# Altium footprint library LukaLIBRARY.PcbLib: 784 footprints (part 2 of 49)
Each footprint in its own frame and in the unit in brackets; x right, y up, seen from the top. Pads: shape width x height; smd on the part's side, far side on the other; paste and mask are expansions set on the pad; w line width, h text height; cw(c..) or ccw(c..) is an arc to the next point about the centre after c.
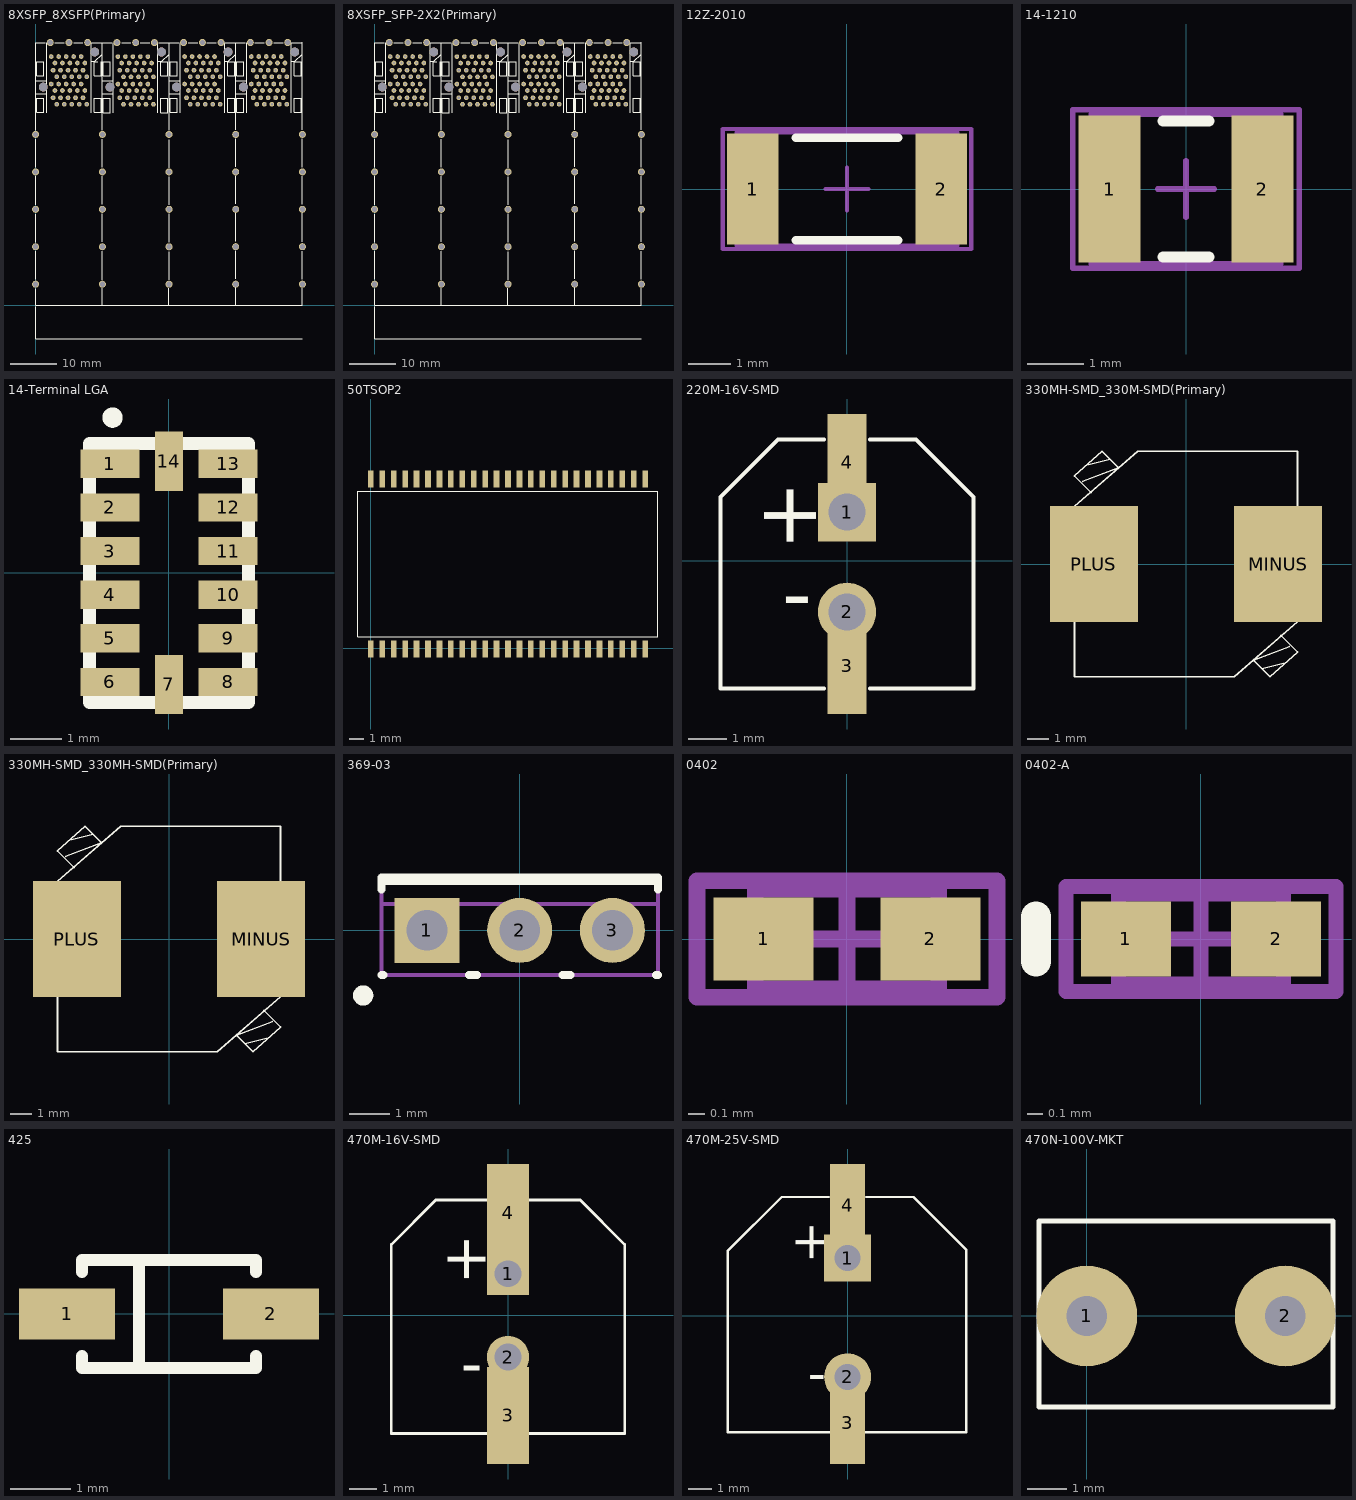
[diagram p1: the footprints below, top view; thin cyan lines are the x and y axes]

## 8XSFP_8XSFP(Primary) [mm]
pads (205):
  round 1.5 hole 1.1: 161(3.13,56.14) 162(7.13,56.14) 163(11.12,56.14) 164(17.38,56.13) 165(21.38,56.13) 166(25.37,56.13) 167(31.63,56.14) 168(35.63,56.14) 169(39.62,56.14) 170(45.88,56.14) 171(49.88,56.14) 172(53.87,56.14) 181(0,36.5) 182(14.26,36.5) 183(28.5,36.5) 184(42.75,36.5) 185(57,36.5) 186(0,28.5) 187(14.26,28.5) 188(28.5,28.5) 189(42.75,28.5) 190(57,28.5) 191(0,20.5) 192(14.26,20.5) 193(28.52,20.5) 194(42.76,20.5) 195(57,20.5) 196(0,12.5) 197(14.26,12.5) 198(28.51,12.49) 199(42.75,12.51) 200(57,12.51) 201(0,4.5) 202(14.26,4.5) 203(28.51,4.5) 204(42.75,4.5) 205(57,4.5)
  round 1.9 hole 1.9: 173(12.63,54.12) 174(26.88,54.11) 175(41.13,54.12) 176(55.38,54.12) 177(1.63,46.62) 178(15.88,46.61) 179(30.13,46.62) 180(44.38,46.62)
  round 1 hole 0.47: L1A(10.53,45.89) L1B(24.78,45.88) L1C(39.03,45.89) L1D(53.28,45.89) L2A(9.73,47.27) L2B(23.98,47.26) L2C(38.23,47.27) L2D(52.48,47.27) L3A(8.93,45.89) L3B(23.18,45.88) L3C(37.43,45.89) L3D(51.68,45.89) L4A(8.13,47.27) L4B(22.38,47.26) L4C(36.63,47.27) L4D(50.88,47.27) L5A(7.33,45.89) L5B(21.58,45.88) L5C(35.83,45.89) L5D(50.08,45.89) L6A(6.53,47.27) L6B(20.78,47.26) L6C(35.03,47.27) L6D(49.28,47.27) L7A(5.73,45.89) L7B(19.98,45.88) L7C(34.23,45.89) L7D(48.48,45.89) L8A(4.93,47.27) L8B(19.18,47.26) L8C(33.43,47.27) L8D(47.68,47.27) L9A(4.13,45.89) L9B(18.38,45.88) L9C(32.63,45.89) L9D(46.88,45.89) L10A(3.33,47.27) L10B(17.58,47.26) L10C(31.83,47.27) L10D(46.08,47.27) L11A(3.73,44.34) L11B(17.98,44.33) L11C(32.23,44.34) L11D(46.48,44.34) L12A(4.53,42.95) L12B(18.78,42.94) L12C(33.03,42.95) L12D(47.28,42.95) L13A(5.33,44.34) L13B(19.58,44.33) L13C(33.83,44.34) L13D(48.08,44.34) L14A(6.13,42.95) L14B(20.38,42.94) L14C(34.63,42.95) L14D(48.88,42.95) L15A(6.93,44.34) L15B(21.18,44.33) L15C(35.43,44.34) L15D(49.68,44.34) L16A(7.73,42.95) L16B(21.98,42.94) L16C(36.23,42.95) L16D(50.48,42.95) L17A(8.53,44.34) L17B(22.78,44.33) L17C(37.03,44.34) L17D(51.28,44.34) L18A(9.33,42.95) L18B(23.58,42.94) L18C(37.83,42.95) L18D(52.08,42.95) L19A(10.13,44.34) L19B(24.38,44.33) L19C(38.63,44.34) L19D(52.88,44.34) L20A(10.93,42.95) L20B(25.18,42.94) L20C(39.43,42.95) L20D(53.68,42.95) T1A(3.73,50.21) T1B(17.98,50.2) T1C(32.23,50.21) T1D(46.48,50.21) T2A(4.53,48.82) T2B(18.78,48.81) T2C(33.03,48.82) T2D(47.28,48.82) T3A(5.33,50.21) T3B(19.58,50.2) T3C(33.83,50.21) T3D(48.08,50.21) T4A(6.13,48.82) T4B(20.38,48.81) T4C(34.63,48.82) T4D(48.88,48.82) T5A(6.93,50.21) T5B(21.18,50.2) T5C(35.43,50.21) T5D(49.68,50.21) T6A(7.73,48.82) T6B(21.98,48.81) T6C(36.23,48.82) T6D(50.48,48.82) T7A(8.53,50.21) T7B(22.78,50.2) T7C(37.03,50.21) T7D(51.28,50.21) T8A(9.33,48.82) T8B(23.58,48.81) T8C(37.83,48.82) T8D(52.08,48.82) T9A(10.13,50.21) T9B(24.38,50.2) T9C(38.63,50.21) T9D(52.88,50.21) T10A(10.93,48.82) T10B(25.18,48.81) T10C(39.43,48.82) T10D(53.68,48.82) T11A(10.53,51.76) T11B(24.78,51.75) T11C(39.03,51.76) T11D(53.28,51.76) T12A(9.73,53.14) T12B(23.98,53.13) T12C(38.23,53.14) T12D(52.48,53.14) T13A(8.93,51.76) T13B(23.18,51.75) T13C(37.43,51.76) T13D(51.68,51.76) T14A(8.13,53.14) T14B(22.38,53.13) T14C(36.63,53.14) T14D(50.88,53.14) T15A(7.33,51.76) T15B(21.58,51.75) T15C(35.83,51.76) T15D(50.08,51.76) T16A(6.53,53.14) T16B(20.78,53.13) T16C(35.03,53.14) T16D(49.28,53.14) T17A(5.73,51.76) T17B(19.98,51.75) T17C(34.23,51.76) T17D(48.48,51.76) T18A(4.93,53.14) T18B(19.18,53.13) T18C(33.43,53.14) T18D(47.68,53.14) T19A(4.13,51.76) T19B(18.38,51.75) T19C(32.63,51.76) T19D(46.88,51.76) T20A(3.33,53.14) T20B(17.58,53.13) T20C(31.83,53.14) T20D(46.08,53.14)
Top Overlay:
  drawing of 168 lines, arcs and shapes, not listed
Bottom Overlay:
  text "T19" at 3.59,51.03 h0.79
  text "T20" at 2.83,52.42 h0.79
  text "T1" at 2.84,49.48 h0.79
  text "T19" at 17.84,51.02 h0.79
  text "T20" at 17.08,52.41 h0.79
  text "T1" at 17.09,49.47 h0.79
  text "L1" at 26.89,45.14 h0.79
  text "L20" at 27.72,42.23 h0.79
  text "L19" at 27.74,43.64 h0.79
  text "L2" at 26.89,46.48 h0.79
  text "T19" at 32.09,51.03 h0.79
  text "T20" at 31.33,52.42 h0.79
  text "T1" at 31.34,49.48 h0.79
  text "L1" at 41.14,45.15 h0.79
  text "L2" at 41.14,46.49 h0.79
  text "L20" at 41.97,42.24 h0.79
  text "L19" at 41.99,43.65 h0.79
  text "T19" at 46.34,51.03 h0.79
  text "T20" at 45.58,52.42 h0.79
  text "T1" at 45.59,49.48 h0.79
  text "L1" at 55.39,45.15 h0.79
  text "L20" at 56.22,42.24 h0.79
  text "L19" at 56.24,43.65 h0.79
  text "L2" at 55.39,46.49 h0.79
  text "T2" at 3.59,48.13 h0.79
  text "T2" at 17.84,48.12 h0.79
  text "T2" at 32.09,48.13 h0.79
  text "T2" at 46.34,48.13 h0.79
  text "L1" at 12.64,45.15 h0.79
  text "L20" at 13.47,42.24 h0.79
  text "L19" at 13.49,43.65 h0.79
  text "L2" at 12.64,46.49 h0.79
Top Solder:
  drawing of 160 lines, arcs and shapes, not listed

## 8XSFP_SFP-2X2(Primary) [mm]
pads (205):
  round 1 hole 0.47: 1A(3.73,50.21) 1B(10.53,45.89) 1C(17.98,50.2) 1D(24.78,45.88) 1E(32.23,50.21) 1F(39.03,45.89) 1G(46.48,50.21) 1H(53.28,45.89) 2A(4.53,48.82) 2B(9.73,47.27) 2C(18.78,48.81) 2D(23.98,47.26) 2E(33.03,48.82) 2F(38.23,47.27) 2G(47.28,48.82) 2H(52.48,47.27) 3A(5.33,50.21) 3B(8.93,45.89) 3C(19.58,50.2) 3D(23.18,45.88) 3E(33.83,50.21) 3F(37.43,45.89) 3G(48.08,50.21) 3H(51.68,45.89) 4A(6.13,48.82) 4B(8.13,47.27) 4C(20.38,48.81) 4D(22.38,47.26) 4E(34.63,48.82) 4F(36.63,47.27) 4G(48.88,48.82) 4H(50.88,47.27) 5A(6.93,50.21) 5B(7.33,45.89) 5C(21.18,50.2) 5D(21.58,45.88) 5E(35.43,50.21) 5F(35.83,45.89) 5G(49.68,50.21) 5H(50.08,45.89) 6A(7.73,48.82) 6B(6.53,47.27) 6C(21.98,48.81) 6D(20.78,47.26) 6E(36.23,48.82) 6F(35.03,47.27) 6G(50.48,48.82) 6H(49.28,47.27) 7A(8.53,50.21) 7B(5.73,45.89) 7C(22.78,50.2) 7D(19.98,45.88) 7E(37.03,50.21) 7F(34.23,45.89) 7G(51.28,50.21) 7H(48.48,45.89) 8A(9.33,48.82) 8B(4.93,47.27) 8C(23.58,48.81) 8D(19.18,47.26) 8E(37.83,48.82) 8F(33.43,47.27) 8G(52.08,48.82) 8H(47.68,47.27) 9A(10.53,51.76) 9B(3.73,44.34) 9C(24.78,51.75) 9D(17.98,44.33) 9E(39.03,51.76) 9F(32.23,44.34) 9G(53.28,51.76) 9H(46.48,44.34) 10A(10.13,50.21) 10B(4.13,45.89) 10C(24.38,50.2) 10D(18.38,45.88) 10E(38.63,50.21) 10F(32.63,45.89) 10G(52.88,50.21) 10H(46.88,45.89) 11A(10.93,48.82) 11B(3.33,47.27) 11C(25.18,48.81) 11D(17.58,47.26) 11E(39.43,48.82) 11F(31.83,47.27) 11G(53.68,48.82) 11H(46.08,47.27) 12A(9.73,53.14) 12B(4.53,42.95) 12C(23.98,53.13) 12D(18.78,42.94) 12E(38.23,53.14) 12F(33.03,42.95) 12G(52.48,53.14) 12H(47.28,42.95) 13A(8.93,51.76) 13B(5.33,44.34) 13C(23.18,51.75) 13D(19.58,44.33) 13E(37.43,51.76) 13F(33.83,44.34) 13G(51.68,51.76) 13H(48.08,44.34) 14A(8.13,53.14) 14B(6.13,42.95) 14C(22.38,53.13) 14D(20.38,42.94) 14E(36.63,53.14) 14F(34.63,42.95) 14G(50.88,53.14) 14H(48.88,42.95) 15A(7.33,51.76) 15B(6.93,44.34) 15C(21.58,51.75) 15D(21.18,44.33) 15E(35.83,51.76) 15F(35.43,44.34) 15G(50.08,51.76) 15H(49.68,44.34) 16A(6.53,53.14) 16B(7.73,42.95) 16C(20.78,53.13) 16D(21.98,42.94) 16E(35.03,53.14) 16F(36.23,42.95) 16G(49.28,53.14) 16H(50.48,42.95) 17A(5.73,51.76) 17B(8.53,44.34) 17C(19.98,51.75) 17D(22.78,44.33) 17E(34.23,51.76) 17F(37.03,44.34) 17G(48.48,51.76) 17H(51.28,44.34) 18A(4.93,53.14) 18B(9.33,42.95) 18C(19.18,53.13) 18D(23.58,42.94) 18E(33.43,53.14) 18F(37.83,42.95) 18G(47.68,53.14) 18H(52.08,42.95) 19A(4.13,51.76) 19B(10.13,44.34) 19C(18.38,51.75) 19D(24.38,44.33) 19E(32.63,51.76) 19F(38.63,44.34) 19G(46.88,51.76) 19H(52.88,44.34) 20A(3.33,53.14) 20B(10.93,42.95) 20C(17.58,53.13) 20D(25.18,42.94) 20E(31.83,53.14) 20F(39.43,42.95) 20G(46.08,53.14) 20H(53.68,42.95)
  round 1.5 hole 1.1: 161(3.13,56.14) 162(7.13,56.14) 163(11.12,56.14) 164(17.38,56.13) 165(21.38,56.13) 166(25.37,56.13) 167(31.63,56.14) 168(35.63,56.14) 169(39.62,56.14) 170(45.88,56.14) 171(49.88,56.14) 172(53.87,56.14) 181(0,36.5) 182(14.26,36.5) 183(28.5,36.5) 184(42.75,36.5) 185(57,36.5) 186(0,28.5) 187(14.26,28.5) 188(28.5,28.5) 189(42.75,28.5) 190(57,28.5) 191(0,20.5) 192(14.26,20.5) 193(28.52,20.5) 194(42.76,20.5) 195(57,20.5) 196(0,12.5) 197(14.26,12.5) 198(28.51,12.49) 199(42.75,12.51) 200(57,12.51) 201(0,4.5) 202(14.26,4.5) 203(28.51,4.5) 204(42.75,4.5) 205(57,4.5)
  round 1.9 hole 1.9: 173(12.63,54.12) 174(26.88,54.11) 175(41.13,54.12) 176(55.38,54.12) 177(1.63,46.62) 178(15.88,46.61) 179(30.13,46.62) 180(44.38,46.62)
Top Overlay:
  drawing of 168 lines, arcs and shapes, not listed
Bottom Overlay:
  text "T19" at 3.59,51.03 h0.79
  text "T20" at 2.83,52.42 h0.79
  text "T1" at 2.84,49.48 h0.79
  text "T19" at 17.84,51.02 h0.79
  text "T20" at 17.08,52.41 h0.79
  text "T1" at 17.09,49.47 h0.79
  text "L1" at 26.89,45.14 h0.79
  text "L20" at 27.72,42.23 h0.79
  text "L19" at 27.74,43.64 h0.79
  text "L2" at 26.89,46.48 h0.79
  text "T19" at 32.09,51.03 h0.79
  text "T20" at 31.33,52.42 h0.79
  text "T1" at 31.34,49.48 h0.79
  text "L1" at 41.14,45.15 h0.79
  text "L2" at 41.14,46.49 h0.79
  text "L20" at 41.97,42.24 h0.79
  text "L19" at 41.99,43.65 h0.79
  text "T19" at 46.34,51.03 h0.79
  text "T20" at 45.58,52.42 h0.79
  text "T1" at 45.59,49.48 h0.79
  text "L1" at 55.39,45.15 h0.79
  text "L20" at 56.22,42.24 h0.79
  text "L19" at 56.24,43.65 h0.79
  text "L2" at 55.39,46.49 h0.79
  text "T2" at 3.59,48.13 h0.79
  text "T2" at 17.84,48.12 h0.79
  text "T2" at 32.09,48.13 h0.79
  text "T2" at 46.34,48.13 h0.79
  text "L1" at 12.64,45.15 h0.79
  text "L20" at 13.47,42.24 h0.79
  text "L19" at 13.49,43.65 h0.79
  text "L2" at 12.64,46.49 h0.79
Top Solder:
  drawing of 160 lines, arcs and shapes, not listed

## 12Z-2010 [mm] "Chip Resistor, Body 5.0x2.5mm, IPC High Density"
height 0.9
pads (2):
  rect 1.2x2.6 smd: 1(-2.2,0) 2(2.2,0)
Top Overlay:
  lines w0.2: -1.2,-1.2 1.2,-1.2 ; -1.2,1.2 1.2,1.2
Mechanical 13:
  lines w0.1: -2.575,-1.325 2.575,-1.325 2.575,1.325 -2.575,1.325 -2.575,-1.325
Mechanical 15:
  lines w0.1: -0.5,0 0.5,0 ; 0,-0.5 0,0.5 ; -2.9,-1.4 2.9,-1.4 2.9,1.4 -2.9,1.4 -2.9,-1.4
3D body: height 0.9, standoff 0, extent -2.575,-1.325 2.575,1.325

## 14-1210 [mm] "Chip Resistor, Body 3.2x2.5mm, IPC High Density"
height 0.9
pads (2):
  rect 1.1x2.6 smd: 1(-1.35,0) 2(1.35,0)
Top Overlay:
  lines w0.2: -0.4,-1.2 0.4,-1.2 ; -0.4,1.2 0.4,1.2
Mechanical 13:
  lines w0.1: -1.675,-1.32 1.675,-1.32 1.675,1.32 -1.675,1.32 -1.675,-1.32
Mechanical 15:
  lines w0.1: -0.5,0 0.5,0 ; 0,-0.5 0,0.5 ; -2,-1.4 2,-1.4 2,1.4 -2,1.4 -2,-1.4
3D body: height 0.9, standoff 0, extent -1.675,-1.32 1.675,1.32

## 14-Terminal LGA [mm] "3 mm × 5 mm × 1 mm"
pads (14):
  rect 1.15x0.55 smd: 1(-1.15,2.125) 2(-1.15,1.275) 3(-1.15,0.425) 4(-1.15,-0.425) 5(-1.15,-1.275) 6(-1.15,-2.125) 8(1.15,-2.125) 9(1.15,-1.275) 10(1.15,-0.425) 11(1.15,0.425) 12(1.15,1.275) 13(1.15,2.125)
  rect 0.55x1.15 smd: 7(0,-2.175) 14(0,2.175)
Top Overlay:
  circle w0.254: c-1.1,3.025 r0.071
  lines w0.254: -1.55,-2.525 -1.55,2.525 1.55,2.525 1.55,-2.525 -1.55,-2.525

## 50TSOP2 [mm]
pads (50):
  rect 0.4x1.2 smd: 1(0,-0.05) 2(0.8,-0.05) 3(1.6,-0.05) 4(2.4,-0.05) 5(3.2,-0.05) 6(4,-0.05) 7(4.8,-0.05) 8(5.6,-0.05) 9(6.4,-0.05) 10(7.2,-0.05) 11(8,-0.05) 12(8.8,-0.05) 13(9.6,-0.05) 14(10.4,-0.05) 15(11.2,-0.05) 16(12,-0.05) 17(12.8,-0.05) 18(13.6,-0.05) 19(14.4,-0.05) 20(15.2,-0.05) 21(16,-0.05) 22(16.8,-0.05) 23(17.6,-0.05) 24(18.4,-0.05) 25(19.2,-0.05) 26(19.2,11.85) 27(18.4,11.85) 28(17.6,11.85) 29(16.8,11.85) 30(16,11.85) 31(15.2,11.85) 32(14.4,11.85) 33(13.6,11.85) 34(12.8,11.85) 35(12,11.85) 36(11.2,11.85) 37(10.4,11.85) 38(9.6,11.85) 39(8.8,11.85) 40(8,11.85) 41(7.2,11.85) 42(6.4,11.85) 43(5.6,11.85) 44(4.8,11.85) 45(4,11.85) 46(3.2,11.85) 47(2.4,11.85) 48(1.6,11.85) 49(0.8,11.85) 50(0,11.85)
Top Overlay:
  lines w0.025: -0.9,0.8 -0.9,11 20.1,11 20.1,0.8 -0.9,0.8

## 220M-16V-SMD [mil]
pads (4):
  rect 60x60 hole 38 mask-1000: 1(0,50)
  round 60 hole 38 mask-1000: 2(0,-52.36)
  rect 40.31x99.37 smd: 3(0,-107.48) 4(0,101.18)
Top Overlay:
  lines w3.94: -23.62,-131.1 -129.92,-131.1 -129.92,65.75 -70.87,124.8 -23.62,124.8 ; 23.62,-131.1 129.92,-131.1 129.92,65.75 70.87,124.8 23.62,124.8
  text "+" at -31.5,10.63 h62.5
  text "-" at -35.43,-16.93 h62.5
Top Solder:
  region: -30,20 30,20 30,80 -30,80
  region: 0,-22.1 -7.83,-23.13 -15.13,-26.16 -21.4,-30.97 -26.2,-37.23 -29.23,-44.53 -30.26,-52.36 -29.23,-60.19 -26.2,-67.49 -21.4,-73.76 -15.13,-78.57 -7.83,-81.59 0,-82.62 7.83,-81.59 15.13,-78.57 21.4,-73.76 26.2,-67.49 29.23,-60.19 30.26,-52.36 29.23,-44.53 26.2,-37.23 21.4,-30.97 15.13,-26.16 7.83,-23.13
Bottom Solder:
  region: -30,20 30,20 30,80 -30,80
  region: 0,-22.1 -7.83,-23.13 -15.13,-26.16 -21.4,-30.97 -26.2,-37.23 -29.23,-44.53 -30.26,-52.36 -29.23,-60.19 -26.2,-67.49 -21.4,-73.76 -15.13,-78.57 -7.83,-81.59 0,-82.62 7.83,-81.59 15.13,-78.57 21.4,-73.76 26.2,-67.49 29.23,-60.19 30.26,-52.36 29.23,-44.53 26.2,-37.23 21.4,-30.97 15.13,-26.16 7.83,-23.13

## 330MH-SMD_330M-SMD(Primary) [mil]
pads (2):
  rect 160x210 smd mask-1000: MINUS(167.5,0) PLUS(-167.5,0)
Top Overlay:
  lines w3: -202.5,-105 -202.5,-205 87.5,-205 202.5,-105 ; -202.5,105 -87.5,205 202.5,205 202.5,105 ; -187.5,150 -122.5,175 -152.5,205 -202.5,160 -172.5,130 ; -177.5,180 -137.5,190 ; 137.5,-190 177.5,-180 ; 172.5,-130 202.5,-160 152.5,-205 122.5,-175 187.5,-150
Top Solder:
  region: 247.5,105 87.5,105 87.5,-105 247.5,-105
  region: -87.5,105 -247.5,105 -247.5,-105 -87.5,-105

## 330MH-SMD_330MH-SMD(Primary) [mil]
pads (2):
  rect 160x210 smd mask-1000: MINUS(167.5,0) PLUS(-167.5,0)
Top Overlay:
  lines w3: -202.5,-105 -202.5,-205 87.5,-205 202.5,-105 ; -202.5,105 -87.5,205 202.5,205 202.5,105 ; -187.5,150 -122.5,175 -152.5,205 -202.5,160 -172.5,130 ; -177.5,180 -137.5,190 ; 137.5,-190 177.5,-180 ; 172.5,-130 202.5,-160 152.5,-205 122.5,-175 187.5,-150
Top Solder:
  region: 247.5,105 87.5,105 87.5,-105 247.5,-105
  region: -87.5,105 -247.5,105 -247.5,-105 -87.5,-105

## 369-03 [mm] "TO, Thru-Hole, Vertical, Heatsink Mounted; 3 In-Line Leads; Pitch 2.28 mm"
height 9.7
pads (3):
  rect 1.6x1.6 hole 1: 1(-2.28,0)
  round 1.6 hole 1: 2(0,0) 3(2.28,0)
Top Overlay:
  circle w0.25: c-3.85,-1.6 r0.125
  lines w0.2: -3.4,-1.1 -3.35,-1.1 ; -3.4,1 -3.4,1.3 3.4,1.3 3.4,1 ; -3.4,1.21 3.4,1.21 ; -1.25,-1.1 -1.05,-1.1 ; 1.05,-1.1 1.25,-1.1 ; 3.35,-1.1 3.4,-1.1
Mechanical 13:
  lines w0.1: -3.4,0.65 3.4,0.65 ; -3.4,-1.1 3.4,-1.1 3.4,1.3 -3.4,1.3 -3.4,-1.1
Mechanical 15:
  lines w0.1: -0.5,0 0.5,0 ; 0,-0.5 0,0.5
3D body: height 9.3, standoff 2.6, extent -3.45,-1.15 3.45,1.35
3D body: height 9.7, standoff 9.3, extent -3.399,0.651 3.399,1.299

## 0402 [mm] "Chip Capacitor, Body 1.0x0.5mm, IPC High Density"
height 1.3
pads (2):
  rect 0.6x0.5 smd: 1(-0.5,0) 2(0.5,0)
Mechanical 13:
  lines w0.1: -0.55,-0.3 -0.55,0.3 0.55,0.3 0.55,-0.3 -0.55,-0.3
Mechanical 15:
  lines w0.1: -0.3,0 0.3,0 ; 0,-0.3 0,0.3 ; -0.9,-0.35 -0.9,0.35 0.9,0.35 0.9,-0.35 -0.9,-0.35
3D body: height 1.3, standoff 0, extent -0.55,-0.3 0.55,0.3

## 0402-A [mm] "Chip Inductor, Body 1.0x0.5mm, IPC High Density"
height 0.55
pads (2):
  rect 0.6x0.5 smd: 1(-0.5,0) 2(0.5,0)
Top Overlay:
  lines w0.2: -1.1,-0.15 -1.1,0.15
Mechanical 13:
  lines w0.1: -0.55,-0.3 0.55,-0.3 0.55,0.3 -0.55,0.3 -0.55,-0.3
Mechanical 15:
  lines w0.1: -0.3,0 0.3,0 ; 0,-0.3 0,0.3 ; -0.9,-0.35 0.9,-0.35 0.9,0.35 -0.9,0.35 -0.9,-0.35
3D body: height 0.55, standoff 0, extent -0.55,-0.3 0.55,0.3

## 425 [mm] "SOD-123; 2 Leads; Body 2.7 x 1.6 mm, (LxW)"
height 1.35
pads (2):
  rect 1.6x0.85 smd: 1(-1.7,0) 2(1.7,0)
Top Overlay:
  lines w0.2: -1.45,-0.7 -1.45,-0.9 1.45,-0.9 1.45,-0.7 ; -1.45,0.7 -1.45,0.9 1.45,0.9 1.45,0.7 ; -0.5,-0.9 -0.5,0.9

## 470M-16V-SMD [mm]
pads (4):
  rect 1.524x1.524 hole 0.965 mask-25.4: 1(0,1.5)
  round 1.524 hole 0.965 mask-25.4: 2(0,-1.5)
  rect 1.5x3.5 smd mask-25.4: 3(0,-3.6) 4(0,3.7)
Top Overlay:
  lines w0.1: -0.6,-4.25 -4.2,-4.25 -4.2,2.55 -2.6,4.15 -0.6,4.15 ; 0.6,-4.25 4.2,-4.25 4.2,2.55 2.6,4.15 0.6,4.15
  text "+" at -0.8,1.1 h1.59
  text "-" at -0.9,-1.31 h1.59
Top Solder:
  region: -0.762,0.738 0.762,0.738 0.762,2.262 -0.762,2.262
  region: 0.75,1.95 0.75,5.45 -0.75,5.45 -0.75,1.95
  region: 0,-0.731 -0.199,-0.758 -0.384,-0.834 -0.543,-0.957 -0.666,-1.116 -0.742,-1.301 -0.769,-1.5 -0.742,-1.699 -0.666,-1.884 -0.543,-2.043 -0.384,-2.166 -0.199,-2.242 0,-2.269 0.199,-2.242 0.384,-2.166 0.543,-2.043 0.666,-1.884 0.742,-1.699 0.769,-1.5 0.742,-1.301 0.666,-1.116 0.543,-0.957 0.384,-0.834 0.199,-0.758
  region: 0.75,-5.35 0.75,-1.85 -0.75,-1.85 -0.75,-5.35
Bottom Solder:
  region: -0.762,0.738 0.762,0.738 0.762,2.262 -0.762,2.262
  region: 0,-0.731 -0.199,-0.758 -0.384,-0.834 -0.543,-0.957 -0.666,-1.116 -0.742,-1.301 -0.769,-1.5 -0.742,-1.699 -0.666,-1.884 -0.543,-2.043 -0.384,-2.166 -0.199,-2.242 0,-2.269 0.199,-2.242 0.384,-2.166 0.543,-2.043 0.666,-1.884 0.742,-1.699 0.769,-1.5 0.742,-1.301 0.666,-1.116 0.543,-0.957 0.384,-0.834 0.199,-0.758

## 470M-25V-SMD [mm]
pads (4):
  rect 2x2 hole 1.1 mask-25.4: 1(0,2.45)
  round 2 hole 1.1 mask-25.4: 2(0,-2.6)
  rect 1.5x3.5 smd mask-25.4: 3(0,-4.55) 4(0,4.7)
Top Overlay:
  lines w0.1: -0.8,5.05 -2.8,5.05 -5.1,2.75 -5.1,-4.95 -0.6,-4.95 ; 0.6,-4.95 5.05,-4.95 5.05,2.8 2.8,5.05 0.8,5.05
  text "+" at -0.85,2.2 h1.59
  text "-" at -0.9,-2.01 h1.59
Top Solder:
  region: -1,1.45 1,1.45 1,3.45 -1,3.45
  region: 0.75,2.95 0.75,6.45 -0.75,6.45 -0.75,2.95
  region: 0,-1.591 -0.261,-1.626 -0.504,-1.727 -0.713,-1.887 -0.873,-2.096 -0.974,-2.339 -1.009,-2.6 -0.974,-2.861 -0.873,-3.104 -0.713,-3.313 -0.504,-3.473 -0.261,-3.574 0,-3.609 0.261,-3.574 0.504,-3.473 0.713,-3.313 0.873,-3.104 0.974,-2.861 1.009,-2.6 0.974,-2.339 0.873,-2.096 0.713,-1.887 0.504,-1.727 0.261,-1.626
  region: 0.75,-6.3 0.75,-2.8 -0.75,-2.8 -0.75,-6.3
Bottom Solder:
  region: -1,1.45 1,1.45 1,3.45 -1,3.45
  region: 0,-1.591 -0.261,-1.626 -0.504,-1.727 -0.713,-1.887 -0.873,-2.096 -0.974,-2.339 -1.009,-2.6 -0.974,-2.861 -0.873,-3.104 -0.713,-3.313 -0.504,-3.473 -0.261,-3.574 0,-3.609 0.261,-3.574 0.504,-3.473 0.713,-3.313 0.873,-3.104 0.974,-2.861 1.009,-2.6 0.974,-2.339 0.873,-2.096 0.713,-1.887 0.504,-1.727 0.261,-1.626

## 470N-100V-MKT [mil]
pads (2):
  round 100 hole 40 mask-1000: 1(0,0) 2(196.85,0)
Top Overlay:
  lines w5: -47.24,-90.55 244.09,-90.55 244.09,94.49 -47.24,94.49 -47.24,-90.55
Top Solder:
  region: 0,50.43 -13.05,48.71 -25.22,43.67 -35.66,35.66 -43.67,25.22 -48.71,13.05 -50.43,0 -48.71,-13.05 -43.67,-25.22 -35.66,-35.66 -25.22,-43.67 -13.05,-48.71 0,-50.43 13.05,-48.71 25.22,-43.67 35.66,-35.66 43.67,-25.22 48.71,-13.05 50.43,0 48.71,13.05 43.67,25.22 35.66,35.66 25.22,43.67 13.05,48.71
  region: 196.85,50.43 183.8,48.71 171.63,43.67 161.19,35.66 153.18,25.22 148.14,13.05 146.42,0 148.14,-13.05 153.18,-25.22 161.19,-35.66 171.63,-43.67 183.8,-48.71 196.85,-50.43 209.9,-48.71 222.07,-43.67 232.51,-35.66 240.53,-25.22 245.56,-13.05 247.28,0 245.56,13.05 240.53,25.22 232.51,35.66 222.07,43.67 209.9,48.71
Bottom Solder:
  region: 0,50.43 -13.05,48.71 -25.22,43.67 -35.66,35.66 -43.67,25.22 -48.71,13.05 -50.43,0 -48.71,-13.05 -43.67,-25.22 -35.66,-35.66 -25.22,-43.67 -13.05,-48.71 0,-50.43 13.05,-48.71 25.22,-43.67 35.66,-35.66 43.67,-25.22 48.71,-13.05 50.43,0 48.71,13.05 43.67,25.22 35.66,35.66 25.22,43.67 13.05,48.71
  region: 196.85,50.43 183.8,48.71 171.63,43.67 161.19,35.66 153.18,25.22 148.14,13.05 146.42,0 148.14,-13.05 153.18,-25.22 161.19,-35.66 171.63,-43.67 183.8,-48.71 196.85,-50.43 209.9,-48.71 222.07,-43.67 232.51,-35.66 240.53,-25.22 245.56,-13.05 247.28,0 245.56,13.05 240.53,25.22 232.51,35.66 222.07,43.67 209.9,48.71